# Altium footprint library Custom_Case.PcbLib: 350 footprints (part 17 of 22)
Each footprint in its own frame and in the unit in brackets; x right, y up, seen from the top. Pads: shape width x height; smd on the part's side, far side on the other; paste and mask are expansions set on the pad; w line width, h text height; cw(c..) or ccw(c..) is an arc to the next point about the centre after c.
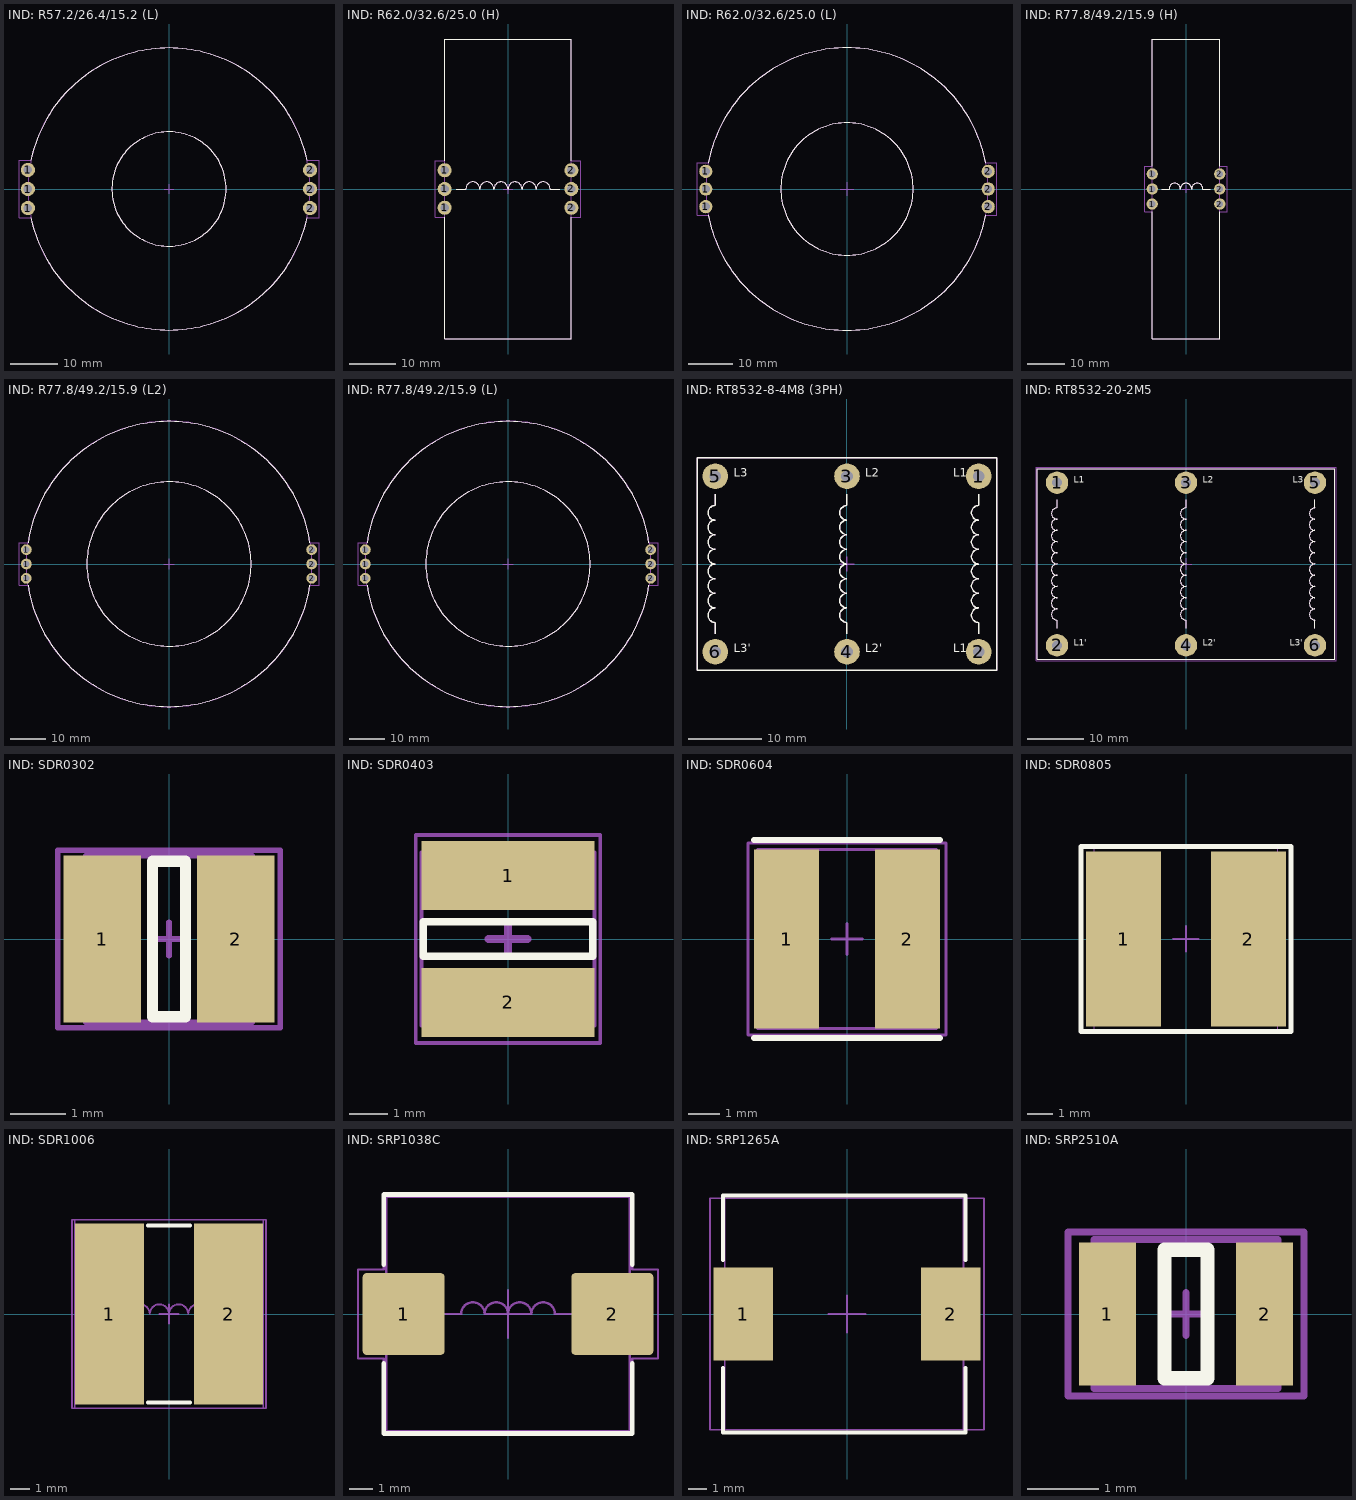
[diagram p16: the footprints below, top view; thin cyan lines are the x and y axes]

## IND: R57.2/26.4/15.2 (L) [mm]
pads (6):
  round 3 hole 1.8: 1(-29.621,-4) 1(-29.621,0) 1(-29.621,4) 2(29.621,-4) 2(29.621,0) 2(29.621,4)
Top Overlay:
  circle w0.2: c0,0 r12
  lines w0.2: -29,-6 ccw(c0,0) 29,-6 ; -29,6 cw(c0,0) 29,6
Top Assy:
  circle w0.1: c0,0 r29.621
  circle w0.1: c0,0 r12
Size Area:
  lines w0.1: -1,0 1,0 ; 0,-1 0,1 ; -31.5,-6 -29,-6 ccw(c0,0) 29,-6 31.5,-6 31.5,6 29,6 ccw(c0,0) -29,6 -31.5,6 -31.5,-6
3D body "F6 R 57.2 x 26.4 x 15.2 v1.step": height 17.23, standoff -0.03, extent -29.621,-29.614 29.621,29.614

## IND: R62.0/32.6/25.0 (H) [mm]
pads (6):
  round 3 hole 1.8: 1(-13.526,-4) 1(-13.526,0) 1(-13.526,4) 2(13.526,-4) 2(13.526,0) 2(13.526,4)
Top Overlay:
  lines w0.2: -13.526,-6 -13.526,-32 13.526,-32 13.526,-6 ; -13.526,6 -13.5,32.016 13.526,32 13.526,6 ; -11,0 -9,0 cw(c-7.5,0) -6,0 cw(c-4.5,0) -3,0 cw(c-1.5,0) 0,0 cw(c1.5,0) 3,0 cw(c4.5,0) 6,0 cw(c7.5,0) 9,0 11,0
Top Assy:
  lines w0.1: -11,0 -9,0 cw(c-7.5,0) -6,0 cw(c-4.5,0) -3,0 cw(c-1.5,0) 0,0 cw(c1.5,0) 3,0 cw(c4.5,0) 6,0 cw(c7.5,0) 9,0 11,0 ; -13.526,-32.016 13.526,-32.016 13.526,32.016 -13.526,32.016 -13.526,-32.016
Size Area:
  lines w0.1: -1,0 1,0 ; 0,-1 0,1 ; -15.5,-6 -13.526,-6 -13.526,-32 13.526,-32.016 13.526,-6 15.5,-6 15.5,6 13.526,6 13.526,32.016 -13.5,32.016 -13.526,6 -15.5,6 -15.5,-6
3D body "F7 R 62.0 x 32.6 x 25.0 v1.step": height 64.02, standoff -0.02, extent -13.526,-32.016 13.526,32.016

## IND: R62.0/32.6/25.0 (L) [mm]
pads (6):
  round 3 hole 1.8: 1(-32,-4) 1(-32,0) 1(-32,4) 2(32,-4) 2(32,0) 2(32,4)
Top Overlay:
  circle w0.2: c0,0 r15
  lines w0.2: -31.435,-5.988 ccw(c0,0) 31.435,-5.988 ; -31.435,5.988 cw(c0,0) 31.435,5.988
Top Assy:
  circle w0.1: c0,0 r15
  circle w0.1: c0,0 r32
Size Area:
  lines w0.1: -1.5,0 1.5,0 ; 0,-1.5 0,1.5 ; -34,-6 -31.435,-5.988 ccw(c0,0) 31.435,-5.988 34,-6 34,5.988 31.435,5.988 ccw(c0,0) -31.435,5.988 -34,5.988 -34,-6
3D body "F7 R 62.0 x 32.6 x 25.0 v1.step": height 27.03, standoff -0.03, extent -32.022,-32.016 32.022,32.016

## IND: R77.8/49.2/15.9 (H) [mm]
pads (6):
  round 3 hole 1.8: 1(-9,-4) 1(-8.976,0) 1(-8.976,4) 2(8.976,0) 2(8.976,4) 2(9,-4)
Top Overlay:
  lines w0.2: -8.976,-6 -8.976,-39.926 8.976,-39.926 8.976,-6 ; -8.976,6 -8.976,39.926 8.976,39.926 8.976,6 ; -6.5,0 -4.5,0 cw(c-3,0) -1.5,0 cw(c0,0) 1.5,0 cw(c3,0) 4.5,0 6.5,0
Top Assy:
  lines w0.1: -6.5,0 -4.5,0 cw(c-3,0) -1.5,0 cw(c0,0) 1.5,0 cw(c3,0) 4.5,0 6.5,0 ; -8.976,-39.926 -8.976,39.926 8.976,39.926 8.976,-39.926 -8.976,-39.926
Size Area:
  lines w0.1: -11,-6 -11,6 -8.976,6 -8.976,39.926 8.976,39.926 8.976,6 11,6 11,-6 8.976,-6 8.976,-39.926 -8.976,-39.926 -8.976,-6 -11,-6
  lines w0.2: -1.016,0 1.016,0 ; 0,-1.016 0,1.016
3D body "F8 R 77.8 x 49.2 x 15.9 v1.step": height 79.93, standoff 0.07, extent -8.976,-39.926 8.976,39.926

## IND: R77.8/49.2/15.9 (L2) [mm]
pads (6):
  round 3 hole 1.8: 1(-40,-4) 1(-39.926,0) 1(-39.926,4) 2(39.926,0) 2(39.926,4) 2(40,-4)
Top Overlay:
  circle w0.2: c0,0 r23
  lines w0.2: -39.473,-5.996 ccw(c0,0) 39.473,-5.996 ; -39.473,5.996 cw(c0,0) 39.473,5.996
3D model:
  circle w0.1: c0,0 r23
  circle w0.1: c0,0 r40
Size Area:
  lines w0.1: -1.5,0 1.5,0 ; 0,-1.5 0,1.5 ; -42,-6 -42,5.996 -39.473,5.996 cw(c0,0) 39.473,5.996 39.5,5.996 42,5.996 42,-5.996 39.473,-5.996 cw(c0,0) -39.473,-5.996 -42,-6
3D body "F8 R 77.8 x 49.2 x 15.9 v3.step": height 34.23, standoff 0.27, extent -39.911,-40.026 39.926,39.826

## IND: R77.8/49.2/15.9 (L) [mm]
pads (6):
  round 3 hole 1.8: 1(-40,-4) 1(-39.926,0) 1(-39.926,4) 2(39.926,0) 2(39.926,4) 2(40,-4)
Top Overlay:
  circle w0.2: c0,0 r23
  lines w0.2: -39.473,-5.996 ccw(c0,0) 39.473,-5.996 ; -39.473,5.996 cw(c0,0) 39.473,5.996
3D model:
  circle w0.1: c0,0 r23
  circle w0.1: c0,0 r40
Size Area:
  lines w0.1: -1.5,0 1.5,0 ; 0,-1.5 0,1.5 ; -42,-6 -42,5.996 -39.473,5.996 cw(c0,0) 39.473,5.996 39.5,5.996 42,5.996 42,-5.996 39.473,-5.996 cw(c0,0) -39.473,-5.996 -42,-6
3D body "F8 R 77.8 x 49.2 x 15.9 v1.step": height 17.73, standoff -0.23, extent -39.926,-39.926 39.926,39.926

## IND: RT8532-8-4M8 (3PH) [mm]
pads (6):
  round 3.5 hole 1.6: 1(18,12) 2(18,-12) 3(0,12) 4(0,-12) 5(-18,12) 6(-18,-12)
Top Overlay:
  lines w0.2: -18,-9.5 -18,-8 cw(c-18,-7) -18,-6 cw(c-18,-5) -18,-4 cw(c-18,-3) -18,-2 cw(c-18,-1) -18,0 cw(c-18,1) -18,2 cw(c-18,3) -18,4 cw(c-18,5) -18,6 cw(c-18,7) -18,8 -18,9.5 ; 0,-9.5 0,-8 cw(c0,-7) 0,-6 cw(c0,-5) 0,-4 cw(c0,-3) 0,-2 cw(c0,-1) 0,0 cw(c0,1) 0,2 cw(c0,3) 0,4 cw(c0,5) 0,6 cw(c0,7) 0,8 0,9.5 ; 18,-9.5 18,-8 cw(c18,-7) 18,-6 cw(c18,-5) 18,-4 cw(c18,-3) 18,-2 cw(c18,-1) 18,0 cw(c18,1) 18,2 cw(c18,3) 18,4 cw(c18,5) 18,6 cw(c18,7) 18,8 18,9.5 ; -20.5,-14.5 20.5,-14.5 20.5,14.5 -20.5,14.5 -20.5,-14.5
  text "L1'" at 14.5,-12.5 h2
  text "L1" at 14.5,11.5 h2
  text "L2'" at 2.5,-12.5 h2
  text "L2" at 2.5,11.5 h2
  text "L3'" at -15.5,-12.5 h2
  text "L3" at -15.5,11.5 h2
Top Assy:
  lines w0.1: -18,-9.5 -18,-8 cw(c-18,-7) -18,-6 cw(c-18,-5) -18,-4 cw(c-18,-3) -18,-2 cw(c-18,-1) -18,0 cw(c-18,1) -18,2 cw(c-18,3) -18,4 cw(c-18,5) -18,6 cw(c-18,7) -18,8 -18,9.5 ; 0,-9.5 0,-8 cw(c0,-7) 0,-6 cw(c0,-5) 0,-4 cw(c0,-3) 0,-2 cw(c0,-1) 0,0 cw(c0,1) 0,2 cw(c0,3) 0,4 cw(c0,5) 0,6 cw(c0,7) 0,8 0,9.5 ; 18,-9.5 18,-8 cw(c18,-7) 18,-6 cw(c18,-5) 18,-4 cw(c18,-3) 18,-2 cw(c18,-1) 18,0 cw(c18,1) 18,2 cw(c18,3) 18,4 cw(c18,5) 18,6 cw(c18,7) 18,8 18,9.5 ; -20.5,-14.5 20.5,-14.5 20.5,14.5 -20.5,14.5 -20.5,-14.5
  text "L3'" at -15.5,-12.5 h2
  text "L3" at -15.5,11.5 h2
  text "L2'" at 2.5,-12.5 h2
  text "L2" at 2.5,11.5 h2
  text "L1'" at 14.5,-12.5 h2
  text "L1" at 14.5,11.5 h2
Size Area:
  lines w0.1: -20.5,-14.5 20.5,-14.5 20.5,14.5 -20.5,14.5 -20.5,-14.5
  lines w0.2: -1.016,0 1.016,0 ; 0,-1.016 0,1.016
3D body "RT8532-8-4M8.STEP": height 43.97, standoff -4, extent -20.5,-14.5 20.5,14.5

## IND: RT8532-20-2M5 [mm]
pads (6):
  round 4 hole 1.8: 1(-23,14.5) 2(-23,-14.5) 3(0,14.5) 4(0,-14.5) 5(23,14.5) 6(23,-14.5)
Top Overlay:
  lines w0.2: -23,-11.5 -23,-10 cw(c-23,-9) -23,-8 cw(c-23,-7) -23,-6 cw(c-23,-5) -23,-4 cw(c-23,-3) -23,-2 cw(c-23,-1) -23,0 cw(c-23,1) -23,2 cw(c-23,3) -23,4 cw(c-23,5) -23,6 cw(c-23,7) -23,8 cw(c-23,9) -23,10 -23,11.5 ; 0,-11.5 0,-10 cw(c0,-9) 0,-8 cw(c0,-7) 0,-6 cw(c0,-5) 0,-4 cw(c0,-3) 0,-2 cw(c0,-1) 0,0 cw(c0,1) 0,2 cw(c0,3) 0,4 cw(c0,5) 0,6 cw(c0,7) 0,8 cw(c0,9) 0,10 0,11.5 ; 23,-11.5 23,-10 cw(c23,-9) 23,-8 cw(c23,-7) 23,-6 cw(c23,-5) 23,-4 cw(c23,-3) 23,-2 cw(c23,-1) 23,0 cw(c23,1) 23,2 cw(c23,3) 23,4 cw(c23,5) 23,6 cw(c23,7) 23,8 cw(c23,9) 23,10 23,11.5 ; -26.5,-17 -26.5,17 26.5,17 26.5,-17 -26.5,-17
  text "L1'" at -20,-15 h2
  text "L3'" at 18.5,-15 h2
  text "L1" at -20,14 h2
  text "L3" at 19,14 h2
  text "L2'" at 3,-15 h2
  text "L2" at 3,14 h2
Top Assy:
  lines w0.1: -23,-11.5 -23,-10 cw(c-23,-9) -23,-8 cw(c-23,-7) -23,-6 cw(c-23,-5) -23,-4 cw(c-23,-3) -23,-2 cw(c-23,-1) -23,0 cw(c-23,1) -23,2 cw(c-23,3) -23,4 cw(c-23,5) -23,6 cw(c-23,7) -23,8 cw(c-23,9) -23,10 -23,11.5 ; 0,-11.5 0,-10 cw(c0,-9) 0,-8 cw(c0,-7) 0,-6 cw(c0,-5) 0,-4 cw(c0,-3) 0,-2 cw(c0,-1) 0,0 cw(c0,1) 0,2 cw(c0,3) 0,4 cw(c0,5) 0,6 cw(c0,7) 0,8 cw(c0,9) 0,10 0,11.5 ; 23,-11.5 23,-10 cw(c23,-9) 23,-8 cw(c23,-7) 23,-6 cw(c23,-5) 23,-4 cw(c23,-3) 23,-2 cw(c23,-1) 23,0 cw(c23,1) 23,2 cw(c23,3) 23,4 cw(c23,5) 23,6 cw(c23,7) 23,8 cw(c23,9) 23,10 23,11.5 ; -26.5,-17 26.5,-17 26.5,17 -26.5,17 -26.5,16.5 -26.5,-17
  text "L3'" at 18.5,-15 h2
  text "L3" at 19,14 h2
  text "L2'" at 3,-15 h2
  text "L2" at 3,14 h2
  text "L1'" at -20,-15 h2
  text "L1" at -20,14 h2
Size Area:
  lines w0.1: -26.75,-17.25 -26.75,17.25 26.75,17.25 26.75,-17.25 -26.75,-17.25
  lines w0.2: -1.016,0 1.016,0 ; 0,-1.016 0,1.016
3D body "RT8532-20-2M5.STEP": height 54.93, standoff -4, extent -26.5,-17 26.5,17

## IND: SDR0302 [mm]
pads (2):
  rect 1.4x3 smd mask+0.075: 1(-1.2,0) 2(1.2,0)
Top Overlay:
  lines w0.2: -0.3,-1.4 0.3,-1.4 0.3,1.4 -0.3,1.4 -0.3,-1.4
3D model:
  lines w0.1: -1.5,-1.5 1.5,-1.5 1.5,1.5 -1.5,1.5 -1.5,-1.5
Size Area:
  lines w0.1: -0.3,0 0.3,0 ; 0,-0.3 0,0.3 ; -2,-1.6 -2,1.6 2,1.6 2,-1.6 -2,-1.6
3D body "User Library-SDR0302.STEP": height 3, standoff 0, extent -1.492,-1.5 1.492,1.5

## IND: SDR0403 [mm]
pads (2):
  rect 4.5x1.8 smd: 1(0,1.65) 2(0,-1.65)
Top Overlay:
  lines w0.2: -2.2,-0.45 -2.2,0.45 2.2,0.45 2.2,-0.45 -2.2,-0.45
Top Assy:
  lines w0.1: -2.25,-2.25 2.25,-2.25 2.25,2.25 -2.25,2.25 -2.25,1.9 -2.25,-2.25
Size Area:
  lines w0.1: -2.4,-2.7 -2.4,2.7 2.4,2.7 2.4,-2.7 -2.4,-2.7
  lines w0.2: -0.508,0 0.508,0 ; 0,-0.45 0,0.45
3D body "User Library-SDR0403.STEP": height 3.5, standoff 0, extent -2.25,-2.25 2.25,2.25

## IND: SDR0604 [mm]
pads (2):
  rect 2.1x5.8 smd: 1(-1.95,0) 2(1.95,0)
Top Overlay:
  lines w0.2: -3,-3.2 3,-3.2 ; -3,3.2 3,3.2
Top Assy:
  lines w0.1: -2.9,-2.9 -2.9,2.9 2.9,2.9 2.9,-2.9 -2.9,-2.9
Size Area:
  lines w0.1: -0.5,0 0.5,0 ; 0,-0.5 0,0.5 ; -3.2,-3.1 -3.2,3.1 3.2,3.1 3.2,-3.1 -3.2,-3.1
3D body "SDR0604.STEP": height 4.8, standoff 0, extent -2.9,-2.9 2.9,2.9

## IND: SDR0805 [mm]
height 5.3
pads (2):
  rect 3x7 smd: 1(-2.5,0) 2(2.5,0)
Top Overlay:
  lines w0.2: -4.2,-3.7 4.2,-3.7 4.2,3.7 -4.2,3.7 -4.2,-3.7
Top Assy:
  lines w0.05: -3.675,-3.75 3.675,-3.75 3.675,3.75 -3.675,3.75 -3.675,-3.75
Size Area:
  lines w0.1: -0.5,0 0.5,0 ; 0,-0.5 0,0.5 ; -4.2,-3.7 -4.2,3.725 4.2,3.725 4.2,-3.7 -4.2,-3.7
3D body "SDR0805.STEP": height 5.08, standoff 0.03, extent -3.677,-3.75 3.677,3.75

## IND: SDR1006 [mm]
pads (2):
  rect 3.6x9.4 smd: 1(-3.1,0) 2(3.1,0)
Top Overlay:
  lines w0.2: -1.1,-4.6 1.1,-4.6 ; -1.1,4.6 1.1,4.6
Top Assy:
  lines w0.1: -4.2,0 -3,0 cw(c-2.5,0) -2,0 cw(c-1.5,0) -1,0 cw(c-0.5,0) 0,0 cw(c0.5,0) 1,0 cw(c1.5,0) 2,0 cw(c2.5,0) 3,0 4.2,0 ; -4.9,-4.9 -4.9,4.9 4.9,4.9 4.9,-4.9 -4.9,-4.9
Size Area:
  lines w0.1: -0.5,0 0.5,0 ; 0,-0.508 0,0.508 ; -5.05,-4.9 5.05,-4.9 5.05,4.9 -5.05,4.9 -5.05,-4.9
3D body "SDR1006.STEP": height 5.8, standoff 0, extent -4.9,-4.9 4.9,4.9

## IND: SRP1038C [mm]
pads (2):
  rrect10% 3.5x3.5 smd mask+0.102: 1(-4.45,0) 2(4.45,0)
Top Overlay:
  lines w0.2: -5.3,-2.1 -5.3,-5.1 5.3,-5.1 5.3,-2.1 ; -5.3,2.1 -5.3,5.1 5.3,5.1 5.3,2.1
Top Assy:
  lines w0.1: -4,0 -2,0 cw(c-1.5,0) -1,0 cw(c-0.5,0) 0,0 cw(c0.5,0) 1,0 cw(c1.5,0) 2,0 4,0 ; -5.2,-5 5.2,-5 5.2,5 -5.2,5 -5.2,-5
Size Area:
  lines w0.1: -1,0 1,0 ; 0,-1.016 0,1.016 ; -6.4,-1.9 -6.4,1.9 -5.3,1.9 -5.3,5.1 5.3,5.1 5.3,1.9 6.4,1.9 6.4,-1.9 5.3,-1.9 5.3,-5.1 -5.3,-5.1 -5.3,-1.9 -6.4,-1.9
3D body "SRP1038A.STEP": height 3.8, standoff 0.05, extent -5.2,-5 5.2,5

## IND: SRP1265A [mm]
pads (2):
  rect 3.2x5 smd: 1(-5.6,0) 2(5.6,0)
Top Overlay:
  lines w0.2: -6.7,-2.9 -6.7,-6.4 6.4,-6.4 6.4,-2.9 ; -6.7,2.9 -6.7,6.4 6.4,6.4 6.4,2.9
Top Assy:
  lines w0.1: -6.6,-6.25 -6.6,6.25 6.3,6.25 6.3,-6.25 -6.6,-6.25
Size Area:
  lines w0.1: -1.016,0 1.016,0 ; 0,-1.016 0,1.016 ; -7.4,-6.25 -7.4,6.25 7.4,6.25 7.4,-6.25 -7.4,-6.25
3D body "SRP1265A series.stp": height 6.31, standoff 0, extent -6.6,-6.25 6.3,6.25

## IND: SRP2510A [mm]
pads (2):
  rect 0.8x2 smd: 1(-1.1,0) 2(1.1,0)
Top Overlay:
  lines w0.2: -0.3,-0.9 -0.3,0.9 0.3,0.9 0.3,-0.9 -0.3,-0.9
Top Assy:
  lines w0.1: -1.285,-1.045 -1.285,1.045 1.285,1.045 1.285,-1.045 -1.285,-1.045
Size Area:
  lines w0.1: -0.3,0 0.3,0 ; 0,-0.3 0,0.3 ; -1.65,-1.15 -1.65,1.15 1.65,1.15 1.65,-1.15 -1.65,-1.15
3D body "666.step": height 0.97, standoff 0.01, extent -1.285,-1.045 1.285,1.045